# Altium footprint library MODULE.PcbLib: 26 footprints (part 1 of 2)
Each footprint in its own frame and in the unit in brackets; x right, y up, seen from the top. Pads: shape width x height; smd on the part's side, far side on the other; paste and mask are expansions set on the pad; w line width, h text height; cw(c..) or ccw(c..) is an arc to the next point about the centre after c.
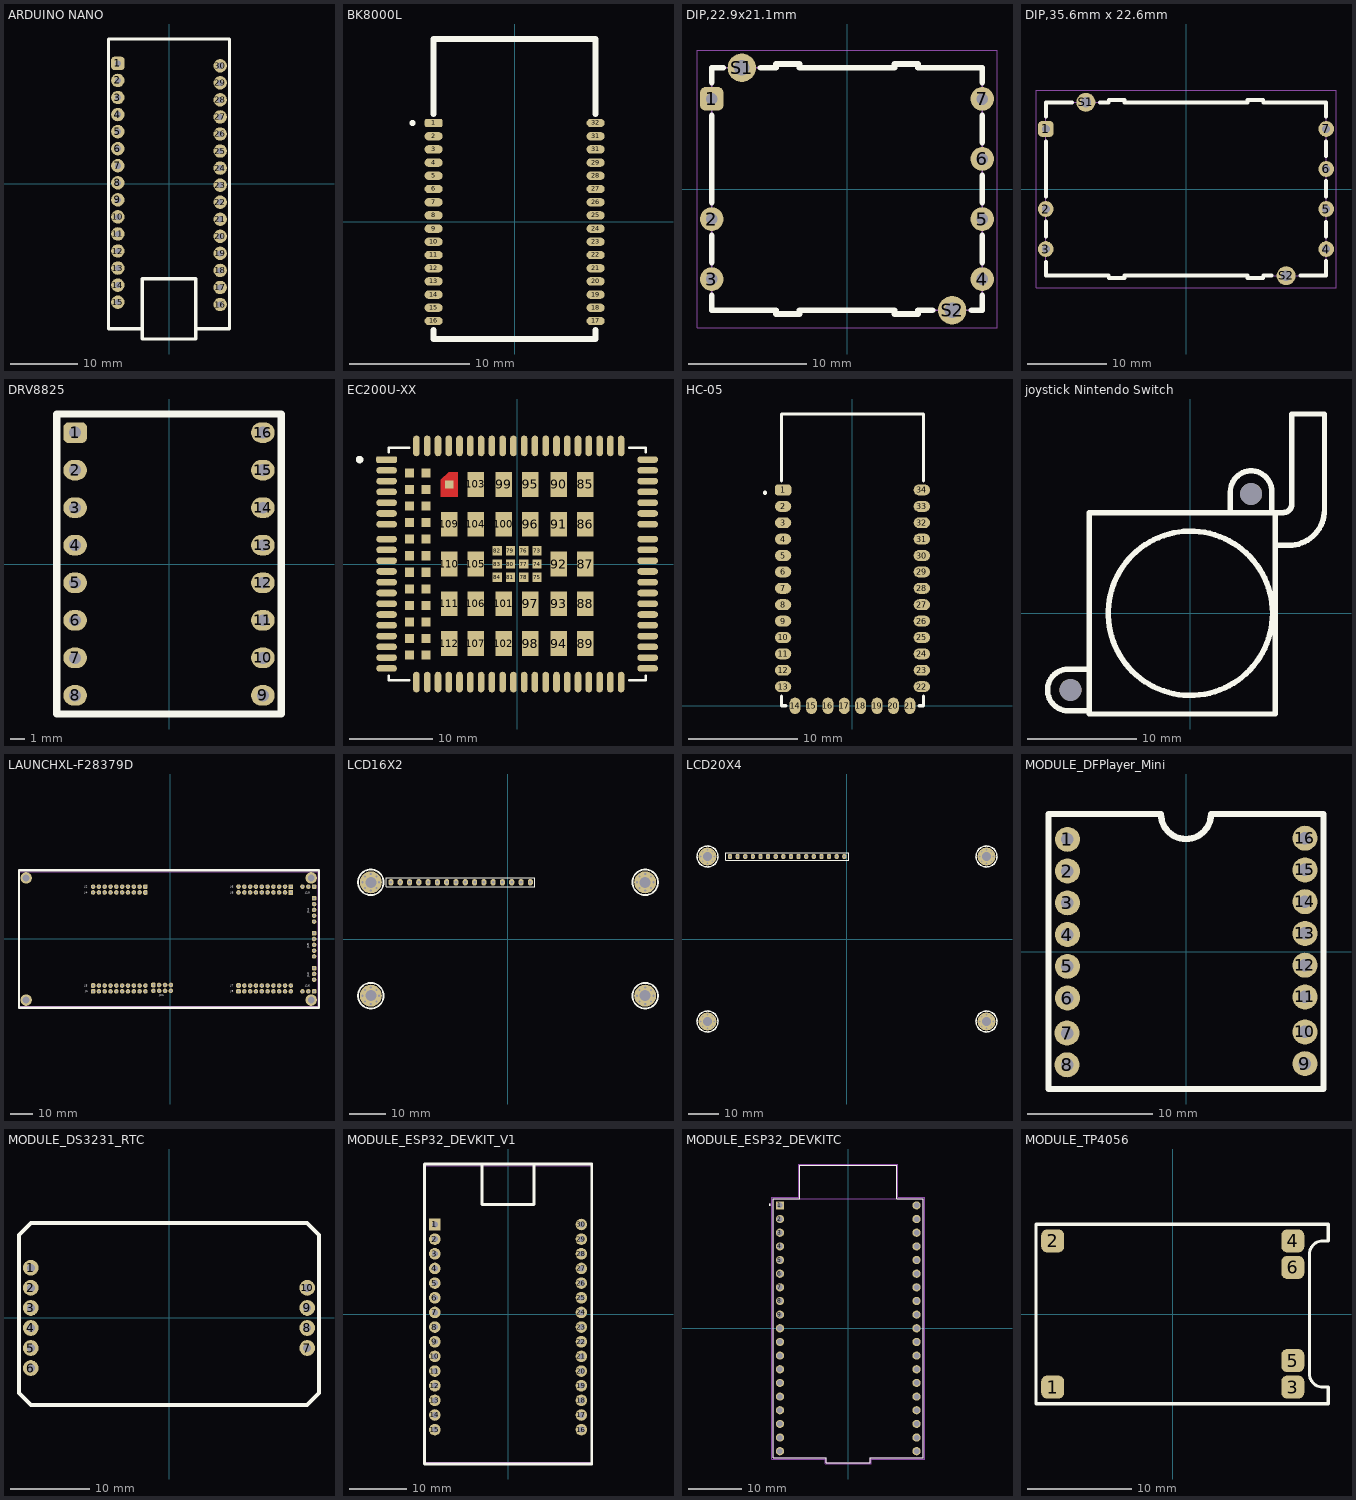
[diagram p0: the footprints below, top view; thin cyan lines are the x and y axes]

## ARDUINO NANO [mm]
pads (30):
  rrect50% 2x2 hole 0.9: 1(-7.62,17.955)
  round 2 hole 0.9: 2(-7.62,15.415) 3(-7.62,12.875) 4(-7.62,10.335) 5(-7.62,7.795) 6(-7.62,5.255) 7(-7.62,2.715) 8(-7.62,0.175) 9(-7.62,-2.365) 10(-7.62,-4.905) 11(-7.62,-7.445) 12(-7.62,-9.985) 13(-7.62,-12.525) 14(-7.62,-15.065) 15(-7.62,-17.605) 16(7.62,-17.955) 17(7.62,-15.415) 18(7.62,-12.875) 19(7.62,-10.335) 20(7.62,-7.795) 21(7.62,-5.255) 22(7.62,-2.715) 23(7.62,-0.175) 24(7.62,2.365) 25(7.62,4.905) 26(7.62,7.445) 27(7.62,9.985) 28(7.62,12.525) 29(7.62,15.065) 30(7.62,17.605)
Top Overlay:
  lines w0.5: -4,-21.59 -4,-23.09 4,-23.09 4,-21.59 ; -4,-21.59 -9,-21.59 -9,21.59 9,21.59 9,-21.59 4,-21.59 ; -4,-21.59 -4,-14.1 4,-14.1 4,-21.59
3D body "Arduino Nano.STEP": height 11.68, standoff -2, extent -9,-22.44 9,21.84

## BK8000L [mm]
pads (32):
  rrect50% 1.5x0.7 smd: 1(-6.75,8.25)
  oval 1.5x0.7 smd: 2(-6.75,7.15) 3(-6.75,6.05) 4(-6.75,4.95) 5(-6.75,3.85) 6(-6.75,2.75) 7(-6.75,1.65) 8(-6.75,0.55) 9(-6.75,-0.55) 10(-6.75,-1.65) 11(-6.75,-2.75) 12(-6.75,-3.85) 13(-6.75,-4.95) 14(-6.75,-6.05) 15(-6.75,-7.15) 16(-6.75,-8.25) 17(6.75,-8.25) 18(6.75,-7.15) 19(6.75,-6.05) 20(6.75,-4.95) 21(6.75,-3.85) 22(6.75,-2.75) 23(6.75,-1.65) 24(6.75,-0.55) 25(6.75,0.55) 26(6.75,1.65) 27(6.75,2.75) 28(6.75,3.85) 29(6.75,4.95) 31(6.75,6.05) 31(6.75,7.15) 32(6.75,8.25)
Top Overlay:
  circle w0.3: c-8.5,8.25 r0.1
  lines w0.5: -6.75,-9 -6.75,-9.75 6.75,-9.75 6.75,-9 ; -6.75,9 -6.75,15.25 6.75,15.25 6.75,9
3D body "User Library-BLK-MD-SPK-B.STEP": height 2.51, standoff 0, extent -7,-9.2 7,13.8

## DIP,22.9x21.1mm [mm]
height 8.5
pads (9):
  rrect50% 2x2 hole 1 mask+0.2: 1(-11.43,7.62)
  round 2 hole 1 mask+0.2: 2(-11.43,-2.54) 3(-11.43,-7.62) 4(11.43,-7.62) 5(11.43,-2.54) 6(11.43,2.54) 7(11.43,7.62)
  round 2.4 hole 1.3 mask+0.2: S1(-8.89,10.25) S2(8.89,-10.25)
Top Overlay:
  lines w0.5: -11.43,-9.017 -11.43,-10.25 -6,-10.25 -6,-10.55 -4,-10.55 -4,-10.25 4,-10.25 4,-10.55 6,-10.55 6,-10.25 7.239,-10.25 ; -11.43,-6.223 -11.43,-3.937 ; -11.43,-1.143 -11.43,6.223 ; -11.43,9.017 -11.43,10.25 -10.46,10.25 ; -7.32,10.25 -6,10.25 -6,10.55 -4,10.55 -4,10.25 4,10.25 4,10.55 6,10.55 6,10.25 11.43,10.25 11.43,9.017 ; 10.541,-10.25 11.43,-10.25 11.43,-9.017 ; 11.43,-6.223 11.43,-3.937 ; 11.43,-1.143 11.43,1.143 ; 11.43,3.937 11.43,6.223
Mechanical 13:
  lines w0.127: -11.43,-10.25 -11.43,10.25 -6,10.25 -6,10.55 -4,10.55 -4,10.25 4,10.25 4,10.55 6,10.55 6,10.25 11.43,10.25 11.43,-10.25 6,-10.25 6,-10.55 4,-10.55 4,-10.25 -4,-10.25 -4,-10.55 -6,-10.55 -6,-10.25 -11.43,-10.25
Mechanical 15:
  lines w0.05: -12.68,-11.75 12.68,-11.75 12.68,11.75 -12.68,11.75 -12.68,-11.75
3D body "step_temp.STEP": height 8.5, standoff -3.5, extent -11.58,-10.55 11.58,10.55

## DIP,35.6mm x 22.6mm [mm]
height 8.5
pads (9):
  rrect50% 2x2 hole 1 mask+0.2: 1(-17.78,7.62)
  round 2 hole 1 mask+0.2: 2(-17.78,-2.54) 3(-17.78,-7.62) 4(17.78,-7.62) 5(17.78,-2.54) 6(17.78,2.54) 7(17.78,7.62)
  round 2.4 hole 1.3 mask+0.2: S1(-12.7,11) S2(12.7,-11)
Top Overlay:
  lines w0.5: -17.78,-9.233 -17.78,-11 -9.8,-11 -9.8,-11.3 -7.8,-11.3 -7.8,-11 7.8,-11 7.8,-11.3 9.8,-11.3 9.8,-11 10.869,-11 ; -17.78,-6.06 -17.78,-4.124 ; -17.78,-0.933 -17.78,6.026 ; -17.78,9.178 -17.78,11 -14.449,11 ; -10.944,11 -9.8,11 -9.8,11.3 -7.8,11.3 -7.8,11 7.8,11 7.8,11.3 9.8,11.3 9.8,11 17.78,11 17.78,9.18 ; 14.501,-11 17.78,-11 17.78,-9.158 ; 17.78,-6.017 17.78,-4.175 ; 17.78,-0.984 17.78,1.01 ; 17.78,4.16 17.78,6.017
Mechanical 13:
  lines w0.127: -17.78,-11 -9.8,-11 -9.8,-11.3 -7.8,-11.3 -7.8,-11 7.8,-11 7.8,-11.3 9.8,-11.3 9.8,-11 17.78,-11 17.78,11 9.8,11 9.8,11.3 7.8,11.3 7.8,11 -7.8,11 -7.8,11.3 -9.8,11.3 -9.8,11 -17.78,11 -17.78,-11
Mechanical 15:
  lines w0.05: -19.03,-12.5 19.03,-12.5 19.03,12.5 -19.03,12.5 -19.03,-12.5
3D body "step_temp.STEP": height 8.5, standoff -3.5, extent -17.93,-11.3 17.93,11.3

## DRV8825 [mm]
pads (16):
  rrect50% 1.6x1.4 hole 0.8 mask+0.15: 1(-6.35,8.89)
  oval 1.6x1.4 hole 0.8 mask+0.15: 2(-6.35,6.35) 3(-6.35,3.81) 4(-6.35,1.27) 5(-6.35,-1.27) 6(-6.35,-3.81) 7(-6.35,-6.35) 8(-6.35,-8.89) 9(6.35,-8.89) 10(6.35,-6.35) 11(6.35,-3.81) 12(6.35,-1.27) 13(6.35,1.27) 14(6.35,3.81) 15(6.35,6.35) 16(6.35,8.89)
Top Overlay:
  lines w0.5: -7.6,-10.15 -7.6,10.15 7.6,10.15 7.6,-10.15 -7.6,-10.15
3D body "DRV8825-PBS-8x2-RADIATOR.stp": height 16.93, standoff -3.06, extent -7.498,-10.16 7.502,10.16

## EC200U-XX [mm]
pads (144):
  rrect50% 2.5x0.8 smd mask+0.15: 1(-15.75,12.6)
  oval 2.5x0.8 smd mask+0.15: 2(-15.75,11.3) 3(-15.75,10) 4(-15.75,8.7) 5(-15.75,7.4) 6(-15.75,6.1) 7(-15.75,4.8) 8(-15.75,0.4) 9(-15.75,-0.9) 10(-15.75,-2.2) 11(-15.75,-3.5) 12(-15.75,-4.8) 13(-15.75,-6.1) 14(-15.75,-7.4) 15(-15.75,-8.7) 16(-15.75,-10) 17(-15.75,-11.3) 18(-15.75,-12.6) 37(15.75,-12.6) 38(15.75,-11.3) 39(15.75,-10) 40(15.75,-8.7) 41(15.75,-7.4) 42(15.75,-6.1) 43(15.75,-4.8) 44(15.75,-3.5) 45(15.75,-2.2) 46(15.75,-0.9) 47(15.75,0.4) 48(15.75,4.8) 49(15.75,6.1) 50(15.75,7.4) 51(15.75,8.7) 52(15.75,10) 53(15.75,11.3) 54(15.75,12.6) 141(-15.75,3) 142(-15.75,1.7) 143(15.75,1.7) 144(15.75,3)
  oval 0.8x2.5 smd mask+0.15: 19(-9.55,-14.25) 20(-8.25,-14.25) 21(-6.95,-14.25) 22(-5.65,-14.25) 23(-4.35,-14.25) 24(-3.05,-14.25) 25(-1.75,-14.25) 26(-0.45,-14.25) 27(0.85,-14.25) 28(2.15,-14.25) 29(3.45,-14.25) 30(4.75,-14.25) 31(6.05,-14.25) 32(7.35,-14.25) 33(8.65,-14.25) 34(9.95,-14.25) 35(11.25,-14.25) 36(12.55,-14.25) 55(12.55,14.25) 56(11.25,14.25) 57(9.95,14.25) 58(8.65,14.25) 59(7.35,14.25) 60(6.05,14.25) 61(4.75,14.25) 62(3.45,14.25) 63(2.15,14.25) 64(0.85,14.25) 65(-0.45,14.25) 66(-1.75,14.25) 67(-3.05,14.25) 68(-4.35,14.25) 69(-5.65,14.25) 70(-6.95,14.25) 71(-8.25,14.25) 72(-9.55,14.25) 113(-10.85,14.25) 114(-12.15,14.25) 115(-10.85,-14.25) 116(-12.15,-14.25)
  rect 1.1x1.1 smd mask+0.15: 73(2.4,1.6) 74(2.4,0) 75(2.4,-1.6) 76(0.8,1.6) 77(0.8,0) 78(0.8,-1.6) 79(-0.8,1.6) 80(-0.8,0) 81(-0.8,-1.6) 82(-2.4,1.6) 83(-2.4,0) 84(-2.4,-1.6) 117(-11,11) 118(-11,9) 119(-11,7) 120(-11,5) 121(-11,3) 122(-11,1) 123(-11,-1) 124(-11,-3) 125(-11,-5) 126(-11,-7) 127(-11,-9) 128(-11,-11) 129(-13,11) 130(-13,9) 131(-13,7) 132(-13,5) 133(-13,3) 134(-13,1) 135(-13,-1) 136(-13,-3) 137(-13,-5) 138(-13,-7) 139(-13,-9) 140(-13,-11)
  rect 2x3 smd mask+0.15: 85(8.2,9.6) 86(8.2,4.8) 87(8.2,0) 88(8.2,-4.8) 89(8.2,-9.6) 90(5,9.6) 91(5,4.8) 92(5,0) 93(5,-4.8) 94(5,-9.6) 95(1.6,9.6) 96(1.6,4.8) 97(1.6,-4.8) 98(1.6,-9.6) 99(-1.6,9.6) 100(-1.6,4.8) 101(-1.6,-4.8) 102(-1.6,-9.6) 103(-5,9.6) 104(-5,4.8) 105(-5,0) 106(-5,-4.8) 107(-5,-9.6) 109(-8.2,4.8) 110(-8.2,0) 111(-8.2,-4.8) 112(-8.2,-9.6)
  rect 1x1 smd paste-1 mask+0: 108(-8.2,9.6)
Top Layer:
  region: -7.15,8.1 -9.2,8.1 -9.2,10.15 -8.25,11.1 -7.15,11.1
Top Overlay:
  circle w0.5: c-19,12.6 r0.2
  lines w0.3: -15.5,-13.5 -15.5,-14 -13,-14 ; -15.5,13.5 -15.5,14 -13,14 ; 13.5,-14 15.5,-14 15.5,-13.5 ; 13.5,14 15.5,14 15.5,13.5
Top Paste:
  region: -7.15,8.1 -9.2,8.1 -9.2,10 -8.1,11.1 -7.15,11.1
Top Solder:
  region: -7,7.95 -9.35,7.95 -9.35,10.25 -8.35,11.25 -7,11.25
3D body "EC200UCNAA-N05-SGNSA--3DModel-STEP-258128.STEP": height 2.55, standoff 0.2, extent -15.5,-14 15.5,14

## HC-05 [mm]
pads (34):
  rrect50% 1.5x1 smd mask+0.1: 1(-6.35,19.75)
  oval 1.5x1 smd mask+0.1: 2(-6.35,18.25) 3(-6.35,16.75) 4(-6.35,15.25) 5(-6.35,13.75) 6(-6.35,12.25) 7(-6.35,10.75) 8(-6.35,9.25) 9(-6.35,7.75) 10(-6.35,6.25) 11(-6.35,4.75) 12(-6.35,3.25) 13(-6.35,1.75) 22(6.35,1.75) 23(6.35,3.25) 24(6.35,4.75) 25(6.35,6.25) 26(6.35,7.75) 27(6.35,9.25) 28(6.35,10.75) 29(6.35,12.25) 30(6.35,13.75) 31(6.35,15.25) 32(6.35,16.75) 33(6.35,18.25) 34(6.35,19.75)
  oval 1x1.5 smd mask+0.1: 14(-5.25,0) 15(-3.75,0) 16(-2.25,0) 17(-0.75,0) 18(0.75,0) 19(2.25,0) 20(3.75,0) 21(5.25,0)
Top Overlay:
  circle w0.2: c-8,19.5 r0.1
  lines w0.3: -6.5,0.9 -6.5,0 -6.1,0 ; -6.5,20.6 -6.5,26.7 6.5,26.7 6.5,20.6 ; 6.1,0 6.5,0 6.5,0.9
3D body "HC05.STEP": height 2.5, standoff 0, extent -6.5,0 6.5,26.7

## joystick Nintendo Switch [mm]
pads (2):
  round 2 hole 2 mask+0.1: ""(-10.95,-7) ""(5.55,10.9)
Top Overlay:
  circle w0.5: c0,0 r7.5
  lines w0.5: -9.25,-8.9 -11.15,-8.9 cw(c-11.15,-7) -11.15,-5.1 -9.25,-5.1 ; 3.65,9.2 3.65,11.1 cw(c5.55,11.1) 7.45,11.1 7.45,9.2 ; 7.75,6.2 9,6.2 ccw(c9,9.45) 12.25,9.45 12.25,18.2 9.25,18.2 9.25,9.95 cw(c8.5,9.95) 8.5,9.2 7.75,9.2 ; 7.75,9.2 7.75,-9.2 -9.25,-9.2 -9.25,9.2 7.75,9.2
3D body "Switch Joystick.STEP": height 13.98, standoff -0.02, extent -12.615,-9.652 11.545,24.568

## LAUNCHXL-F28379D [mm]
pads (111):
  rrect50% 2x2 hole 0.9: J1_1(-33.655,-22.86) J2_1(-10.795,22.86) J3_1(-33.655,-20.32) J4_1(-10.795,20.32) J5_1(29.845,-22.86) J7_1(29.845,-20.32) J10_1(62.865,22.86) J12_1(62.865,-12.7) J14_1(62.865,17.78) J15_1(62.865,2.54) J16_1(62.865,-22.86) J21_1(-7.311,-20.086)
  round 2 hole 0.9: J1_2(-31.115,-22.86) J1_3(-28.575,-22.86) J1_4(-26.035,-22.86) J1_5(-23.495,-22.86) J1_6(-20.955,-22.86) J1_7(-18.415,-22.86) J1_8(-15.875,-22.86) J1_9(-13.335,-22.86) J1_10(-10.795,-22.86) J2_2(-13.335,22.86) J2_3(-15.875,22.86) J2_4(-18.415,22.86) J2_5(-20.955,22.86) J2_6(-23.495,22.86) J2_7(-26.035,22.86) J2_8(-28.575,22.86) J2_9(-31.115,22.86) J2_10(-33.655,22.86) J3_2(-31.115,-20.32) J3_3(-28.575,-20.32) J3_4(-26.035,-20.32) J3_5(-23.495,-20.32) J3_6(-20.955,-20.32) J3_7(-18.415,-20.32) J3_8(-15.875,-20.32) J3_9(-13.335,-20.32) J3_10(-10.795,-20.32) J4_2(-13.335,20.32) J4_3(-15.875,20.32) J4_4(-18.415,20.32) J4_5(-20.955,20.32) J4_6(-23.495,20.32) J4_7(-26.035,20.32) J4_8(-28.575,20.32) J4_9(-31.115,20.32) J4_10(-33.655,20.32) J5_2(32.385,-22.86) J5_3(34.925,-22.86) J5_4(37.465,-22.86) J5_5(40.005,-22.86) J5_6(42.545,-22.86) J5_7(45.085,-22.86) J5_8(47.625,-22.86) J5_9(50.165,-22.86) J5_10(52.705,-22.86) J6_2(50.165,22.86) J6_3(47.625,22.86) J6_4(45.085,22.86) J6_5(42.545,22.86) J6_6(40.005,22.86) J6_7(37.465,22.86) J6_8(34.925,22.86) J6_9(32.385,22.86) J6_10(29.845,22.86) J7_2(32.385,-20.32) J7_3(34.925,-20.32) J7_4(37.465,-20.32) J7_5(40.005,-20.32) J7_6(42.545,-20.32) J7_7(45.085,-20.32) J7_8(47.625,-20.32) J7_9(50.165,-20.32) J7_10(52.705,-20.32) J8_2(50.165,20.32) J8_3(47.625,20.32) J8_4(45.085,20.32) J8_5(42.545,20.32) J8_6(40.005,20.32) J8_7(37.465,20.32) J8_8(34.925,20.32) J8_9(32.385,20.32) J8_10(29.845,20.32) J10_2(60.325,22.86) J10_3(57.785,22.86) J12_2(62.865,-15.24) J12_3(62.865,-17.78) J14_2(62.865,15.24) J14_3(62.865,12.7) J14_4(62.865,10.16) J14_5(62.865,7.62) J15_2(62.865,0) J15_3(62.865,-2.54) J15_4(62.865,-5.08) J15_5(62.865,-7.62) J16_2(60.325,-22.86) J16_3(57.785,-22.86) J21_2(-7.311,-22.626) J21_3(-4.771,-20.086) J21_4(-4.771,-22.626) J21_5(-2.231,-20.086) J21_6(-2.231,-22.626) J21_7(0.309,-20.086) J21_8(0.309,-22.626)
  rect 2x2 hole 0.9: J6_1(52.705,22.86) J8_1(52.705,20.32)
  round 5 hole 3 unplated: ""(-62.865,-26.67) ""(-62.865,26.67) ""(61.595,-26.67) ""(61.595,26.67)
Top Overlay:
  lines w1: -66,-30 -66,30 65,30 65,-30 -66,-30
  text "J6" at 26.467,22.36 h1
  text "J8" at 26.467,19.82 h1
  text "J14" at 60.7,11.35 h1
  text "J16" at 58.95,-20.8 h1
  text "J12" at 60.7,-16.65 h1
  text "J15" at 60.7,-4.05 h1
  text "J10" at 58.95,19.8 h1
  text "J21" at -4.666,-25 h1
  text "J5" at 26.467,-23.36 h1
  text "J7" at 26.467,-20.82 h1
  text "J4" at -37.333,19.82 h1
  text "J2" at -37.333,22.36 h1
  text "J3" at -37.333,-20.82 h1
  text "J1" at -37.166,-23.36 h1
Mechanical 15:
  lines w0.05: -65.655,-29.46 -65.655,29.46 64.639,29.46 64.639,-29.46 -65.655,-29.46
3D body "LAUNCHXL-F28379D--3DModel-STEP-56544.STEP": height 19.15, standoff 0.39, extent -66.395,-29.21 64.397,31.485

## LCD16X2 [mm]
pads (52):
  oval 1.4x1.8 hole 0.7 mask+0.15: 1(-32,15.5) 2(-29.46,15.5) 3(-26.92,15.5) 4(-24.38,15.5) 5(-21.84,15.5) 6(-19.3,15.5) 7(-16.76,15.5) 8(-14.22,15.5) 9(-11.68,15.5) 10(-9.14,15.5) 11(-6.6,15.5) 12(-4.06,15.5) 13(-1.52,15.5) 14(1.02,15.5) 15(3.56,15.5) 16(6.1,15.5)
  round 0.6 hole 0.6 mask+0: ""(-39.75,-15.5) ""(-39.75,15.5) ""(-39.091,-17.091) ""(-39.091,-13.909) ""(-39.091,13.909) ""(-39.091,17.091) ""(-37.5,-17.75) ""(-37.5,-13.25) ""(-37.5,13.25) ""(-37.5,17.75) ""(-35.909,-17.091) ""(-35.909,-13.909) ""(-35.909,13.909) ""(-35.909,17.091) ""(-35.25,-15.5) ""(-35.25,15.5) ""(35.25,-15.5) ""(35.25,15.5) ""(35.909,-17.091) ""(35.909,-13.909) ""(35.909,13.909) ""(35.909,17.091) ""(37.5,-17.75) ""(37.5,-13.25) ""(37.5,13.25) ""(37.5,17.75) ""(39.091,-17.091) ""(39.091,-13.909) ""(39.091,13.909) ""(39.091,17.091) ""(39.75,-15.5) ""(39.75,15.5)
  round 6 hole 3 mask+0.3: ""(-37.5,-15.5) ""(-37.5,15.5) ""(37.5,-15.5) ""(37.5,15.5)
Top Overlay:
  circle w0.5: c-37.5,15.5 r3.5
  circle w0.5: c-37.5,-15.5 r3.5
  circle w0.5: c37.5,-15.5 r3.5
  circle w0.5: c37.5,15.5 r3.5
  lines w0.3: -33.27,14.25 -33.27,16.75 7.37,16.75 7.37,14.25 -33.27,14.25
Bottom Overlay:
  circle w0.5: c-37.5,15.5 r3.5
  circle w0.5: c-37.5,-15.5 r3.5
  circle w0.5: c37.5,-15.5 r3.5
  circle w0.5: c37.5,15.5 r3.5
3D body "LCD.STEP": height 16.8, standoff -1.5, extent -40,-18 40,18

## LCD20X4 [mm]
pads (52):
  oval 1.4x1.8 hole 0.7 mask+0.15: 1(-39,27.5) 2(-36.46,27.5) 3(-33.92,27.5) 4(-31.38,27.5) 5(-28.84,27.5) 6(-26.3,27.5) 7(-23.76,27.5) 8(-21.22,27.5) 9(-18.68,27.5) 10(-16.14,27.5) 11(-13.6,27.5) 12(-11.06,27.5) 13(-8.52,27.5) 14(-5.98,27.5) 15(-3.44,27.5) 16(-0.9,27.5)
  round 0.6 hole 0.6 mask+0: ""(-48.75,-27.5) ""(-48.75,27.5) ""(-48.091,-29.091) ""(-48.091,-25.909) ""(-48.091,25.909) ""(-48.091,29.091) ""(-46.5,-29.75) ""(-46.5,-25.25) ""(-46.5,25.25) ""(-46.5,29.75) ""(-44.909,-29.091) ""(-44.909,-25.909) ""(-44.909,25.909) ""(-44.909,29.091) ""(-44.25,-27.5) ""(-44.25,27.5) ""(44.25,-27.5) ""(44.25,27.5) ""(44.909,-29.091) ""(44.909,-25.909) ""(44.909,25.909) ""(44.909,29.091) ""(46.5,-29.75) ""(46.5,-25.25) ""(46.5,25.25) ""(46.5,29.75) ""(48.091,-29.091) ""(48.091,-25.909) ""(48.091,25.909) ""(48.091,29.091) ""(48.75,-27.5) ""(48.75,27.5)
  round 6 hole 3 mask+0.3: ""(-46.5,-27.5) ""(-46.5,27.5) ""(46.5,-27.5) ""(46.5,27.5)
Top Overlay:
  circle w0.5: c46.5,27.5 r3.5
  circle w0.5: c46.5,-27.5 r3.5
  circle w0.5: c-46.5,-27.5 r3.5
  circle w0.5: c-46.5,27.5 r3.5
  lines w0.3: -40.47,26.25 -40.47,28.75 0.57,28.75 0.57,26.25 -40.47,26.25
Bottom Overlay:
  circle w0.5: c46.5,27.5 r3.5
  circle w0.5: c46.5,-27.5 r3.5
  circle w0.5: c-46.5,-27.5 r3.5
  circle w0.5: c-46.5,27.5 r3.5
3D body "QP5522 Jaycar 20x4 LCD Module v14.step": height 13.54, standoff -6, extent -49,-30 49,30

## MODULE_DFPlayer_Mini [mm]
pads (16):
  round 2 hole 1: 1(-9.481,8.973) 2(-9.481,6.433) 3(-9.481,3.893) 4(-9.481,1.353) 5(-9.481,-1.187) 6(-9.481,-3.727) 7(-9.519,-6.525) 8(-9.519,-9.065) 9(9.519,-8.973) 10(9.519,-6.433) 11(9.519,-3.635) 12(9.519,-1.095) 13(9.519,1.445) 14(9.519,3.985) 15(9.519,6.525) 16(9.519,9.065)
Top Overlay:
  lines w0.5: -11,-11 -11,11 -2,11 ccw(c0,11) 2,11 11,11 11,-11 -11,-11
3D body "DFPlayer Mini Assem v1.step": height 6, standoff -5.2, extent -10.4,-13.06 10.4,10.4

## MODULE_DS3231_RTC [mm]
pads (10):
  round 2 hole 1 mask+0.2: 1(-17.5,6.35) 2(-17.5,3.81) 3(-17.5,1.27) 4(-17.5,-1.27) 5(-17.5,-3.81) 6(-17.5,-6.35) 7(17.5,-3.81) 8(17.5,-1.27) 9(17.5,1.27) 10(17.5,3.81)
Top Overlay:
  lines w0.5: -19,-9.5 -19,10.5 -17.5,12 17.5,12 19,10.5 19,-9.5 17.5,-11 -17.5,-11 -19,-9.5
3D body "User Library-DS3231 Timer Assembly.STEP": height 15, standoff -2.63, extent -19.17,-10.3 19.17,11.5

## MODULE_ESP32_DEVKIT_V1 [mm]
height 6.8
pads (30):
  rect 2x2 hole 1.02: 1(-12.7,15.515)
  round 2 hole 1.02: 2(-12.7,12.975) 3(-12.7,10.435) 4(-12.7,7.895) 5(-12.7,5.355) 6(-12.7,2.815) 7(-12.7,0.275) 8(-12.7,-2.265) 9(-12.7,-4.805) 10(-12.7,-7.345) 11(-12.7,-9.885) 12(-12.7,-12.425) 13(-12.7,-14.965) 14(-12.7,-17.505) 15(-12.7,-20.045) 16(12.7,-20.045) 17(12.7,-17.505) 18(12.7,-14.965) 19(12.7,-12.425) 20(12.7,-9.885) 21(12.7,-7.345) 22(12.7,-4.805) 23(12.7,-2.265) 24(12.7,0.275) 25(12.7,2.815) 26(12.7,5.355) 27(12.7,7.895) 28(12.7,10.435) 29(12.7,12.975) 30(12.7,15.515)
Top Overlay:
  lines w0.5: -4.5,26 -4.5,19 4.5,19 4.5,26 ; -14.5,-26 14.5,-26 14.5,26 -14.5,26 -14.5,-26
Mechanical 15:
  lines w0.05: -14.53,-25.725 -14.53,25.725 14.48,25.725 14.48,-25.725 -14.53,-25.725
3D body "ESP32-DEVKIT-V1--3DModel-STEP-269445.STEP": height 7.05, standoff -6, extent -14.227,-26.027 13.973,26.423

## MODULE_ESP32_DEVKITC [mm]
pads (38):
  rect 1.53x1.53 hole 1.02: 1(-12.7,22.85)
  round 1.53 hole 1.02: 2(-12.7,20.31) 3(-12.7,17.77) 4(-12.7,15.23) 5(-12.7,12.69) 6(-12.7,10.15) 7(-12.7,7.61) 8(-12.7,5.07) 9(-12.7,2.53) 10(-12.7,-0.01) 11(-12.7,-2.55) 12(-12.7,-5.09) 13(-12.7,-7.63) 14(-12.7,-10.17) 15(-12.7,-12.71) 16(-12.7,-15.25) 17(-12.7,-17.79) 18(-12.7,-20.33) 19(-12.7,-22.87) 20(12.7,-22.87) 21(12.7,-20.33) 22(12.7,-17.79) 23(12.7,-15.25) 24(12.7,-12.71) 25(12.7,-10.17) 26(12.7,-7.63) 27(12.7,-5.09) 28(12.7,-2.55) 29(12.7,-0.01) 30(12.7,2.53) 31(12.7,5.07) 32(12.7,7.61) 33(12.7,10.15) 34(12.7,12.69) 35(12.7,15.23) 36(12.7,17.77) 37(12.7,20.31) 38(12.7,22.85)
Top Overlay:
  circle w0.2: c-14.57,22.97 r0.1
  lines w0.127: -13.95,-24.1 -4.07,-24.1 -4.07,-25 4.06,-25 4.06,-24.1 13.95,-24.1 13.95,24.1 9,24.1 9,30.3 -9,30.3 -9,24.1 -13.95,24.1 -13.95,-24.1
Mechanical 13:
  circle w0.2: c-14.57,22.97 r0.1
  lines w0.127: -9,24.1 -9,30.3 9,30.3 9,24.1 ; -9,24.1 -13.95,24.1 -13.95,-24.1 -4.07,-24.1 -4.07,-25 4.06,-25 4.06,-24.1 13.95,-24.1 13.95,24.1 9,24.1 ; -9,24.1 9,24.1
Mechanical 15:
  lines w0.05: -14.2,-24.38 -4.32,-24.38 -4.32,-25.25 4.31,-25.25 4.31,-24.38 14.2,-24.38 14.2,24.38 9.25,24.38 9.25,30.55 -9.25,30.55 -9.25,24.38 -14.2,24.38 -14.2,-24.38
3D body "ESP32-DEVKITC--3DModel-STEP-56544.STEP": height 11.25, standoff -1.44, extent -13.97,-24.8 13.97,30.3

## MODULE_TP4056 [mm]
pads (6):
  rrect50% 2.2x2.2 smd: 1(-11.5,-7) 2(-11.5,7) 3(11.5,-7) 4(11.5,7) 5(11.5,-4.46) 6(11.5,4.46)
Top Overlay:
  lines w0.3: -13.1,-8.6 14.9,-8.6 14.9,-7 14.37,-7 cw(c14.37,-5.73) 13.1,-5.73 13.1,-5 13.1,5 13.1,5.73 cw(c14.37,5.73) 14.37,7 14.9,7 14.9,8.6 -13.1,8.6 -13.1,-8.6
3D body "TP4056_Charging_Module_Type_C.step": height 4.14, standoff 0, extent -14.15,-8.7 15.15,8.7